# Altium footprint library LimeNet-Micro_2v1.PcbLib: 86 footprints (part 1 of 6)
Each footprint in its own frame and in the unit in brackets; x right, y up, seen from the top. Pads: shape width x height; smd on the part's side, far side on the other; paste and mask are expansions set on the pad; w line width, h text height; cw(c..) or ccw(c..) is an arc to the next point about the centre after c.
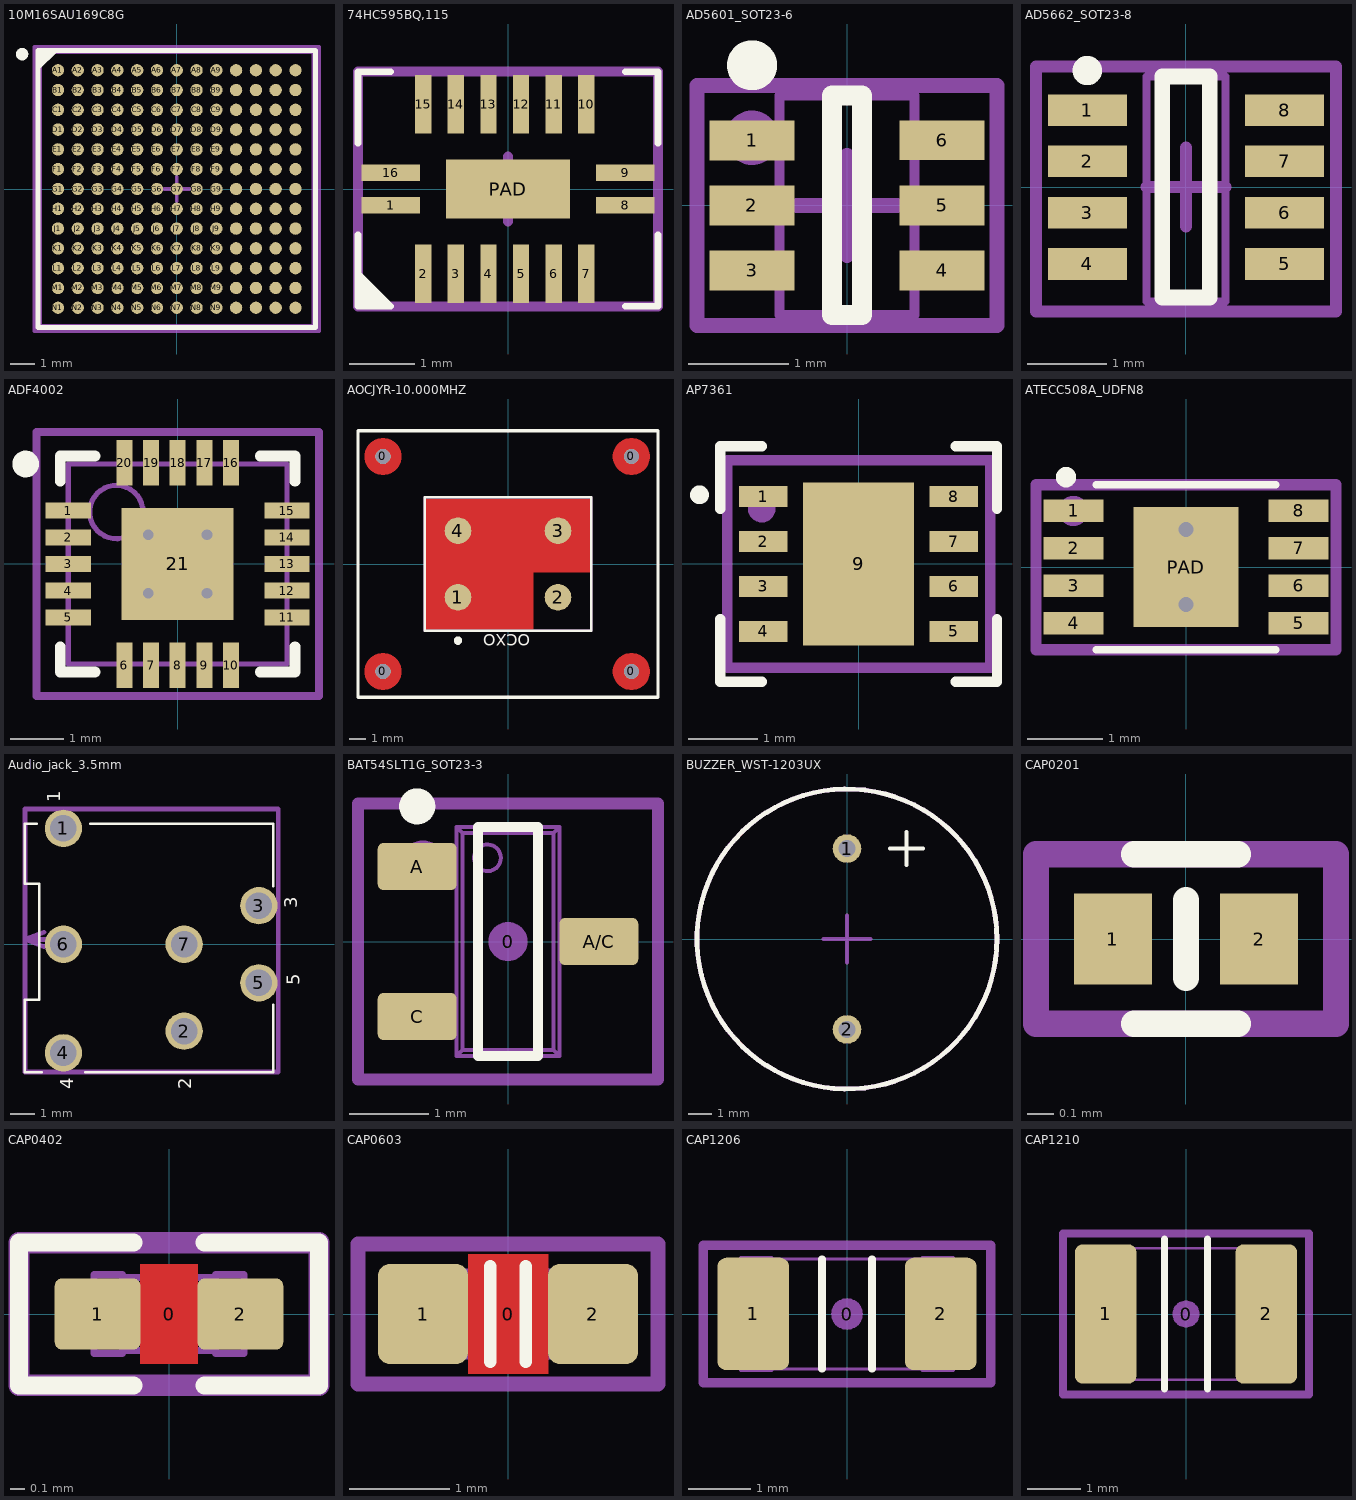
[diagram p0: the footprints below, top view; thin cyan lines are the x and y axes]

## 10M16SAU169C8G [mm]
pads (169):
  round 0.5 smd mask+0.05: A1(-4.8,4.8) A2(-4,4.8) A3(-3.2,4.8) A4(-2.4,4.8) A5(-1.6,4.8) A6(-0.8,4.8) A7(0,4.8) A8(0.8,4.8) A9(1.6,4.8) A10(2.4,4.8) A11(3.2,4.8) A12(4,4.8) A13(4.8,4.8) B1(-4.8,4) B2(-4,4) B3(-3.2,4) B4(-2.4,4) B5(-1.6,4) B6(-0.8,4) B7(0,4) B8(0.8,4) B9(1.6,4) B10(2.4,4) B11(3.2,4) B12(4,4) B13(4.8,4) C1(-4.8,3.2) C2(-4,3.2) C3(-3.2,3.2) C4(-2.4,3.2) C5(-1.6,3.2) C6(-0.8,3.2) C7(0,3.2) C8(0.8,3.2) C9(1.6,3.2) C10(2.4,3.2) C11(3.2,3.2) C12(4,3.2) C13(4.8,3.2) D1(-4.8,2.4) D2(-4,2.4) D3(-3.2,2.4) D4(-2.4,2.4) D5(-1.6,2.4) D6(-0.8,2.4) D7(0,2.4) D8(0.8,2.4) D9(1.6,2.4) D10(2.4,2.4) D11(3.2,2.4) D12(4,2.4) D13(4.8,2.4) E1(-4.8,1.6) E2(-4,1.6) E3(-3.2,1.6) E4(-2.4,1.6) E5(-1.6,1.6) E6(-0.8,1.6) E7(0,1.6) E8(0.8,1.6) E9(1.6,1.6) E10(2.4,1.6) E11(3.2,1.6) E12(4,1.6) E13(4.8,1.6) F1(-4.8,0.8) F2(-4,0.8) F3(-3.2,0.8) F4(-2.4,0.8) F5(-1.6,0.8) F6(-0.8,0.8) F7(0,0.8) F8(0.8,0.8) F9(1.6,0.8) F10(2.4,0.8) F11(3.2,0.8) F12(4,0.8) F13(4.8,0.8) G1(-4.8,0) G2(-4,0) G3(-3.2,0) G4(-2.4,0) G5(-1.6,0) G6(-0.8,0) G7(0,0) G8(0.8,0) G9(1.6,0) G10(2.4,0) G11(3.2,0) G12(4,0) G13(4.8,0) H1(-4.8,-0.8) H2(-4,-0.8) H3(-3.2,-0.8) H4(-2.4,-0.8) H5(-1.6,-0.8) H6(-0.8,-0.8) H7(0,-0.8) H8(0.8,-0.8) H9(1.6,-0.8) H10(2.4,-0.8) H11(3.2,-0.8) H12(4,-0.8) H13(4.8,-0.8) J1(-4.8,-1.6) J2(-4,-1.6) J3(-3.2,-1.6) J4(-2.4,-1.6) J5(-1.6,-1.6) J6(-0.8,-1.6) J7(0,-1.6) J8(0.8,-1.6) J9(1.6,-1.6) J10(2.4,-1.6) J11(3.2,-1.6) J12(4,-1.6) J13(4.8,-1.6) K1(-4.8,-2.4) K2(-4,-2.4) K3(-3.2,-2.4) K4(-2.4,-2.4) K5(-1.6,-2.4) K6(-0.8,-2.4) K7(0,-2.4) K8(0.8,-2.4) K9(1.6,-2.4) K10(2.4,-2.4) K11(3.2,-2.4) K12(4,-2.4) K13(4.8,-2.4) L1(-4.8,-3.2) L2(-4,-3.2) L3(-3.2,-3.2) L4(-2.4,-3.2) L5(-1.6,-3.2) L6(-0.8,-3.2) L7(0,-3.2) L8(0.8,-3.2) L9(1.6,-3.2) L10(2.4,-3.2) L11(3.2,-3.2) L12(4,-3.2) L13(4.8,-3.2) M1(-4.8,-4) M2(-4,-4) M3(-3.2,-4) M4(-2.4,-4) M5(-1.6,-4) M6(-0.8,-4) M7(0,-4) M8(0.8,-4) M9(1.6,-4) M10(2.4,-4) M11(3.2,-4) M12(4,-4) M13(4.8,-4) N1(-4.8,-4.8) N2(-4,-4.8) N3(-3.2,-4.8) N4(-2.4,-4.8) N5(-1.6,-4.8) N6(-0.8,-4.8) N7(0,-4.8) N8(0.8,-4.8) N9(1.6,-4.8) N10(2.4,-4.8) N11(3.2,-4.8) N12(4,-4.8) N13(4.8,-4.8)
Top Overlay:
  circle w0.25: c-6.25,5.45 r0.125
  region: -4.919,5.6 -5.6,4.919 -5.6,5.6
  lines w0.2: -5.6,4.919 -4.919,5.6 ; -5.6,-5.6 -5.6,5.6 5.6,5.6 5.6,-5.6 -5.6,-5.6
Mechanical 13:
  lines w0.1: -5.5,-5.5 -5.5,5.5 5.5,5.5 5.5,-5.5 -5.5,-5.5
Mechanical 15:
  circle w0.2: c-4.8,4.8 r0.1
  lines w0.15: -0.5,0 0.5,0 ; 0,-0.5 0,0.5 ; -5.75,-5.75 -5.75,5.75 5.75,5.75 5.75,-5.75 -5.75,-5.75
  text ".Designator" at 0.856,0.722 h0.55
3D body: height 1.55, standoff 0, extent -5.5,-5.5 5.5,5.5
3D body: height 1.65, standoff 1.55, extent -5.2,4.4 -4.4,5.2

## 74HC595BQ,115 [mm]
pads (17):
  rect 0.9x0.25 smd mask+0.05: 1(-1.8,-0.25) 8(1.8,-0.25) 9(1.8,0.25) 16(-1.8,0.25)
  rect 0.25x0.9 smd mask+0.05: 2(-1.3,-1.3) 3(-0.8,-1.3) 4(-0.3,-1.3) 5(0.2,-1.3) 6(0.7,-1.3) 7(1.2,-1.3) 10(1.2,1.3) 11(0.7,1.3) 12(0.2,1.3) 13(-0.3,1.3) 14(-0.8,1.3) 15(-1.3,1.3)
  rect 1.9x0.9 smd paste-2 mask+0.05: PAD(0,0)
Top Overlay:
  region: -1.8,-1.8 -2.3,-1.3 -2.3,-1.8
  lines w0.1: -2.3,-1 -2.3,-1.3 -1.8,-1.8 -2.3,-1.8 -2.3,-0.7 ; -2.3,0.7 -2.3,1.8 -1.8,1.8 ; 1.8,-1.8 2.3,-1.8 2.3,-0.7 ; 1.8,1.8 2.3,1.8 2.3,0.7
Top Paste:
  region: 0.55,0.2 0.55,-0.2 0.15,-0.2 0.15,0.2
  region: -0.55,0.2 -0.55,-0.2 -0.15,-0.2 -0.15,0.2
Mechanical 15:
  circle w0.1: c-1.825,-0.25 r0.05
  lines w0.15: -0.5,0 0,0 ; 0,-0.5 0,0 ; 0,0.5 0,0 ; 0.5,0 0,0 ; -2.3,-1.8 2.3,-1.8 2.3,1.8 -2.3,1.8 -2.3,-1.8
  text ".Designator" at 1.5,-1.05 h0.55
3D body: height 1, standoff 0, extent -1.8,-1.075 1.8,1.075

## AD5601_SOT23-6 [mm]
pads (6):
  rect 0.85x0.4 smd mask+0.05: 1(-0.95,0.65) 2(-0.95,0) 3(-0.95,-0.65) 4(0.95,-0.65) 5(0.95,0) 6(0.95,0.65)
Top Overlay:
  circle w0.25: c-0.95,1.4 r0.125
  lines w0.2: -0.15,-1.1 -0.15,1.1 0.15,1.1 0.15,-1.1 -0.15,-1.1
Mechanical 13:
  lines w0.1: -0.675,-1.1 0.675,-1.1 0.675,1.1 -0.675,1.1 -0.675,-1.1
Mechanical 15:
  circle w0.4: c-0.95,0.675 r0.071
  lines w0.15: -0.5,0 0.5,0 ; 0,-0.5 0,0.5 ; -1.5,-1.2 1.5,-1.2 1.5,1.2 -1.5,1.2 -1.5,-1.2
3D body "User Library-SC70-6.step": height 0.43, standoff -0.53, extent -1.05,-1 1.05,1

## AD5662_SOT23-8 [mm]
pads (8):
  rect 1x0.4 smd mask+0.05: 1(-1.25,0.975) 2(-1.25,0.325) 3(-1.25,-0.325) 4(-1.25,-0.975) 5(1.25,-0.975) 6(1.25,-0.325) 7(1.25,0.325) 8(1.25,0.975)
Top Overlay:
  circle w0.3: c-1.25,1.475 r0.035
  lines w0.2: -0.3,-1.4 0.3,-1.4 0.3,1.4 -0.3,1.4 -0.3,-1.4
Mechanical 13:
  lines w0.1: -0.5,-1.45 -0.5,1.4 0.5,1.4 0.5,-1.45 -0.5,-1.45
Mechanical 15:
  circle w0.2: c-1.275,0.975 r0.056
  lines w0.15: -0.5,0 0.5,0 ; 0,-0.5 0,0.5 ; -1.9,-1.575 -1.9,1.525 1.9,1.525 1.9,-1.575 -1.9,-1.575
  text ".Designator" at -0.875,-1.3 h0.55
3D body "User Library-sot238.step": height 1.2, standoff 0, extent -1.4,-1.49 1.4,1.45

## ADF4002 [mm]
pads (21):
  rect 0.85x0.3 smd mask+0.05: 1(-2.05,1) 2(-2.05,0.5) 3(-2.05,0) 4(-2.05,-0.5) 5(-2.05,-1) 11(2.05,-1) 12(2.05,-0.5) 13(2.05,0) 14(2.05,0.5) 15(2.05,1)
  rect 0.3x0.85 smd mask+0.05: 6(-1,-1.9) 7(-0.5,-1.9) 8(0,-1.9) 9(0.5,-1.9) 10(1,-1.9) 16(1,1.9) 17(0.5,1.9) 18(0,1.9) 19(-0.5,1.9) 20(-1,1.9)
  rect 2.1x2.1 smd: 21(0,0)
via 0.55,-0.55 diameter 0.5 hole 0.2
via -0.55,-0.55 diameter 0.5 hole 0.2
via 0.55,0.55 diameter 0.5 hole 0.2
via -0.55,0.55 diameter 0.5 hole 0.2
Top Overlay:
  circle w0.25: c-2.85,1.875 r0.125
  lines w0.2: -2.2,-1.55 -2.2,-2.025 -1.55,-2.025 ; -2.2,1.55 -2.2,2.025 -1.55,2.025 ; 1.55,-2.025 2.2,-2.025 2.2,-1.55 ; 1.55,2.025 2.2,2.025 2.2,1.55
Mechanical 13:
  circle w0.1: c-1.15,0.975 r0.5
  lines w0.1: -2.05,-1.875 2.05,-1.875 2.05,1.875 -2.05,1.875 -2.05,-1.875
Mechanical 15:
  lines w0.15: -0.5,0 0.5,0 ; 0,-0.5 0,0.5 ; -2.65,-2.475 2.65,-2.475 2.65,2.475 -2.65,2.475 -2.65,-2.475
  text ".Designator" at 0.925,0.913 h0.55
3D body "User Library-QFN4x4_20pins.step": height 0.8, standoff 0, extent -2.025,-2.02 2.015,2.02

## AOCJYR-10.000MHZ [mm]
pads (8):
  round 0.9 hole 0.9 unplated: 0(-7.5,6.45) 0(-7.5,-6.45) 0(7.4,-6.45) 0(7.4,6.45)
  round 1.6 smd mask+0.05: 1(-3,-2) 2(3,-2) 3(3,2) 4(-3,2)
Top Layer:
  pour cut-out: 4.9,-0.5 4.9,3.9 -4.9,3.9 -4.9,-3.9 1.525,-3.9 1.525,-0.5
  pour cut-out: 7.4,6.45 7.4,7.55 7.508,7.55 7.721,7.508 7.921,7.425 8.101,7.304 8.254,7.151 8.375,6.971 8.458,6.771 8.5,6.558 8.5,6.45
  pour cut-out: 7.4,6.45 7.4,5.35 7.292,5.35 7.079,5.392 6.879,5.475 6.699,5.596 6.546,5.749 6.425,5.929 6.342,6.129 6.3,6.342 6.3,6.45
  pour cut-out: 7.4,6.45 6.3,6.45 6.3,6.558 6.342,6.771 6.425,6.971 6.546,7.151 6.699,7.304 6.879,7.425 7.079,7.508 7.292,7.55 7.4,7.55
  pour cut-out: 7.4,6.45 8.5,6.45 8.5,6.342 8.458,6.129 8.375,5.929 8.254,5.749 8.101,5.596 7.921,5.475 7.721,5.392 7.508,5.35 7.4,5.35
  pour cut-out: -7.5,6.45 -7.5,7.55 -7.392,7.55 -7.179,7.508 -6.979,7.425 -6.799,7.304 -6.646,7.151 -6.525,6.971 -6.442,6.771 -6.4,6.558 -6.4,6.45
  pour cut-out: -7.5,6.45 -7.5,5.35 -7.608,5.35 -7.821,5.392 -8.021,5.475 -8.201,5.596 -8.354,5.749 -8.475,5.929 -8.558,6.129 -8.6,6.342 -8.6,6.45
  pour cut-out: -7.5,6.45 -8.6,6.45 -8.6,6.558 -8.558,6.771 -8.475,6.971 -8.354,7.151 -8.201,7.304 -8.021,7.425 -7.821,7.508 -7.608,7.55 -7.5,7.55
  pour cut-out: -7.5,6.45 -6.4,6.45 -6.4,6.342 -6.442,6.129 -6.525,5.929 -6.646,5.749 -6.799,5.596 -6.979,5.475 -7.179,5.392 -7.392,5.35 -7.5,5.35
  pour cut-out: -7.5,-6.45 -7.5,-5.35 -7.392,-5.35 -7.179,-5.392 -6.979,-5.475 -6.799,-5.596 -6.646,-5.749 -6.525,-5.929 -6.442,-6.129 -6.4,-6.342 -6.4,-6.45
  pour cut-out: -7.5,-6.45 -7.5,-7.55 -7.608,-7.55 -7.821,-7.508 -8.021,-7.425 -8.201,-7.304 -8.354,-7.151 -8.475,-6.971 -8.558,-6.771 -8.6,-6.558 -8.6,-6.45
  pour cut-out: -7.5,-6.45 -8.6,-6.45 -8.6,-6.342 -8.558,-6.129 -8.475,-5.929 -8.354,-5.749 -8.201,-5.596 -8.021,-5.475 -7.821,-5.392 -7.608,-5.35 -7.5,-5.35
  pour cut-out: -7.5,-6.45 -6.4,-6.45 -6.4,-6.558 -6.442,-6.771 -6.525,-6.971 -6.646,-7.151 -6.799,-7.304 -6.979,-7.425 -7.179,-7.508 -7.392,-7.55 -7.5,-7.55
  pour cut-out: 7.4,-6.45 8.5,-6.45 8.5,-6.558 8.458,-6.771 8.375,-6.971 8.254,-7.151 8.101,-7.304 7.921,-7.425 7.721,-7.508 7.508,-7.55 7.4,-7.55
  pour cut-out: 7.4,-6.45 6.3,-6.45 6.3,-6.342 6.342,-6.129 6.425,-5.929 6.546,-5.749 6.699,-5.596 6.879,-5.475 7.079,-5.392 7.292,-5.35 7.4,-5.35
  pour cut-out: 7.4,-6.45 7.4,-7.55 7.292,-7.55 7.079,-7.508 6.879,-7.425 6.699,-7.304 6.546,-7.151 6.425,-6.971 6.342,-6.771 6.3,-6.558 6.3,-6.45
  pour cut-out: 7.4,-6.45 7.4,-5.35 7.508,-5.35 7.721,-5.392 7.921,-5.475 8.101,-5.596 8.254,-5.749 8.375,-5.929 8.458,-6.129 8.5,-6.342 8.5,-6.45
Top Overlay:
  circle w0.3: c-3,-4.6 r0.1
  lines w0.15: -5,-4 5,-4 5,4 -5,4 -5,-4
  lines w0.2: -9,-8 -9,8 9,8 9,-8 -9,-8
  text "OCXO" at 1.325,-4.225 h0.7
Top Solder:
  drawing of 16 lines, arcs and shapes, not listed
Mechanical 15:
  circle w0.3: c-3,-2 r0.141
  lines w0.15: -1.25,0 1.25,0 ; 0,-1.25 0,1.25 ; -5,-4 -5,4 5,4 5,-4 -5,-4
  text ".Designator" at 2.225,-0.575 h0.55
3D body: height 4.1, standoff 0, extent -4.85,-3.75 4.85,3.75
3D body: height 4.2, standoff 4.1, extent -3.492,-2.498 -2.496,-1.5
3D body: height 0.4, standoff 0, extent -4.9,-3 -4.75,3
3D body: height 0.4, standoff 0, extent 4.75,-3 4.9,3

## AP7361 [mm]
pads (9):
  rect 0.7x0.3 smd mask+0.05: 1(-1.375,0.975) 2(-1.375,0.325) 3(-1.375,-0.325) 4(-1.375,-0.975) 5(1.375,-0.975) 6(1.375,-0.325) 7(1.375,0.325) 8(1.375,0.975)
  rect 1.6x2.35 smd mask+0.05: 9(0,0)
Top Overlay:
  circle w0.2: c-2.3,1 r0.035
  lines w0.15: -2,-0.8 -2,-1.7 -1.4,-1.7 ; -2,0.8 -2,1.7 -1.4,1.7 ; 1.4,-1.7 2,-1.7 2,-0.8 ; 1.4,1.7 2,1.7 2,0.8
Mechanical 15:
  circle w0.2: c-1.4,0.8 r0.1
  lines w0.15: -0.4,0 0,0 ; 0,-0.4 0,0 ; 0,0.4 0,0 ; 0.4,0 0,0 ; -1.9,-1.5 1.9,-1.5 1.9,1.5 -1.9,1.5 -1.9,-1.5
  text ".Designator" at 0.93,1.214 h0.55
3D body "User Library-DFN8_3x3mm__65mm.step": height 0.8, standoff 0, extent -1.52,-1.5 1.5,1.5

## ATECC508A_UDFN8 [mm]
pads (9):
  rect 0.8x0.3 smd mask+0.05: 1(-1.5,0.75) 2(-1.5,0.25) 3(-1.5,-0.25) 4(-1.5,-0.75) 5(1.5,-0.75) 6(1.5,-0.25) 7(1.5,0.25) 8(1.5,0.75)
  rect 1.4x1.6 smd mask+0.05: PAD(0,0)
via 0,-0.5 diameter 0.4 hole 0.2
via 0,0.5 diameter 0.4 hole 0.2
Top Overlay:
  circle w0.2: c-1.6,1.2 r0.035
  lines w0.1: -1.2,-1.1 1.2,-1.1 ; -1.2,1.1 1.2,1.1
Mechanical 15:
  circle w0.3: c-1.5,0.75 r0.05
  lines w0.15: -0.3,0 0.3,0 ; 0,-0.3 0,0.3 ; -2,-1.1 -2,1.1 2,1.1 2,-1.1 -2,-1.1
  text ".Designator" at -1.3,-0.9 h0.55
3D body "User Library-UDFN-8_2X3_0,5.step": height 0.53, standoff 0, extent -1.5,-1 1.5,1

## Audio_jack_3.5mm [mm]
pads (7):
  round 1.55 hole 1.1 mask+0.05: 1(2.9,4.8) 2(7.9,-3.6) 3(11,1.6) 4(2.9,-4.5) 5(11,-1.6) 6(2.9,0) 7(7.9,0)
Top Overlay:
  lines w0.1: 1.8,5 1.3,5 1.3,2.5 1.9,2.5 1.9,-2.3 1.3,-2.3 1.3,-5.3 2,-5.3 ; 3.8,-5.3 11.6,-5.3 11.6,-2.5 ; 4,5 11.6,5 11.6,2.4
  text "5" at 12.7,-1.7 h0.55
  text "4" at 3.3,-6 h0.55
  text "3" at 12.6,1.5 h0.55
  text "2" at 8.2,-6 h0.55
  text "1" at 2.775,5.885 h0.55
Mechanical 15:
  lines w0.2: 2.1,-0.1 1.3,0.2 ; 2.1,0.5 1.3,0.2 ; 2.8,0.2 1.3,0.2 ; 1.3,-5.3 1.3,5.6 11.8,5.6 11.8,-5.3 1.3,-5.3
  text "1" at 3.2,3.5 h0.55
  text "2" at 6.8,-3.8 h0.55
  text "3" at 9.9,1.5 h0.55
  text "4" at 3.2,-3.4 h0.55
  text "5" at 9.9,-1.7 h0.55
  text ".Designator" at 6.925,-0.615 h0.55
  text "Board edge" at 3.6,-2.7 h0.55
3D body "SJ-43514.stp": height 5.2, standoff -2.05, extent -2.5,-5.3 11.5,4.9

## BAT54SLT1G_SOT23-3 [mm]
pads (4):
  round 0.5 on Mech15: 0(0,0)
  rrect25% 1x0.6 smd: A(-1.15,0.95) A/C(1.15,0) C(-1.15,-0.95)
Top Overlay:
  circle w0.254: c-1.15,1.712 r0.102
  lines w0.127: -0.381,-1.45 -0.381,1.45 0.381,1.45 0.381,-1.45 -0.381,-1.45
Mechanical 13:
  circle w0.05: c-0.26,1.06 r0.169
  lines w0.05: -1.19,-1.19 -1.19,-0.71 ; -1.19,0.71 -1.19,1.19 ; -1.099,-1.19 -1.099,-0.71 ; -1.099,0.71 -1.099,1.19 ; -1.074,-1.19 -1.074,-0.71 ; -1.074,0.71 -1.074,1.19 ; -0.825,-1.19 -0.825,-0.71 ; -0.825,0.71 -0.825,1.19 ; -0.65,-1.19 -1.4,-1.19 -1.4,-0.71 -0.65,-0.71 ; -0.65,0.71 -1.4,0.71 -1.4,1.19 -0.65,1.19 ; 0.65,-0.24 1.4,-0.24 1.4,0.24 0.65,0.24 ; 0.825,-0.24 0.825,0.24 ; 1.074,-0.24 1.074,0.24 ; 1.099,-0.24 1.099,0.24 ; 1.19,-0.24 1.19,0.24 ; -0.65,-1.45 0.65,-1.45 ; -0.65,-1.45 -0.65,1.45 ; -0.65,-1.45 -0.576,-1.376 ; -0.65,1.45 -0.576,1.376 ; -0.65,1.45 0.65,1.45 ; -0.576,-1.376 0.576,-1.376 ; -0.576,-1.376 -0.576,1.376 ; -0.576,1.376 0.576,1.376 ; 0.576,-1.376 0.65,-1.45 ; 0.576,-1.376 0.576,1.376 ; 0.576,1.376 0.65,1.45 ; 0.65,-1.45 0.65,1.45
Mechanical 15:
  circle w0.35: c-1.073,0.975 r0.127
  lines w0.15: -1.9,-1.75 -1.9,1.75 1.9,1.75 1.9,-1.75 -1.9,-1.75
  text ".Designator" at -1.125,0.45 h0.55
3D body "SOT23-3.STEP": height 1.29, standoff -0.01, extent -1.4,-1.45 1.4,1.45

## BUZZER_WST-1203UX [mm]
pads (2):
  round 1.2 hole 0.7 mask+0.05: 1(0,3.8) 2(0,-3.8)
Top Overlay:
  circle w0.2: c0,0 r6.3
  lines w0.15: 1.8,3.8 3.2,3.8 ; 2.5,3.1 2.5,4.5
Mechanical 15:
  circle w0.2: c0,0 r6.301
  lines w0.15: -1,0 0,0 ; 0,-1 0,0 ; 0,1 0,0 ; 1,0 0,0
  text "positive (longer pin)" at -1.5,-5.175 h0.55
  text ".Designator" at 2.1,-0.45 h0.55
3D body "User Library-WST-1203UX.step": height 9.65, standoff -4.5, extent -6,-6.027 6,9.427

## CAP0201 [mm]
pads (2):
  rect 0.3x0.35 smd mask+0.05: 1(-0.28,0) 2(0.28,0)
Top Overlay:
  lines w0.1: -0.2,-0.325 0.2,-0.325 ; -0.2,0.325 0.2,0.325 ; 0,-0.15 0,0.15
Mechanical 15:
  circle w0.05: c0,0 r0.025
  lines w0.1: -0.575,-0.325 -0.575,0.325 0.575,0.325 0.575,-0.325 -0.575,-0.325
  text ".Designator" at 0.255,-8 h0.55
3D body: height 0.25, standoff 0, extent 0.17,-0.15 0.3,0.15
3D body: height 0.25, standoff 0, extent -0.3,-0.15 -0.17,0.15
3D body: height 0.25, standoff 0, extent -0.17,-0.15 0.17,0.15

## CAP0402 [mm]
pads (3):
  round 0.2 on Mech15: 0(0,0)
  rrect20% 0.6x0.5 smd: 1(-0.5,0) 2(0.5,0)
Top Layer:
  pour cut-out: -0.2,0.35 0.2,0.35 0.2,-0.35 -0.2,-0.35
Top Overlay:
  lines w0.127: -0.25,-0.5 -1.05,-0.5 -1.05,0.5 -0.25,0.5 ; 0.25,-0.5 1.05,-0.5 1.05,0.5 0.25,0.5
Mechanical 13:
  lines w0.05: -0.325,-0.255 0.325,-0.255 ; -0.325,0.255 0.325,0.255 ; -0.525,-0.275 -0.325,-0.275 -0.325,0.275 -0.525,0.275 -0.525,-0.275 ; 0.325,-0.275 0.325,0.275 0.525,0.275 0.525,-0.275 0.325,-0.275
Mechanical 15:
  lines w0.15: -1.05,-0.5 1.05,-0.5 1.05,0.5 -1.05,0.5 -1.05,-0.5
  text ".Designator" at -0.972,-1.375 h0.55
3D body "CAP 0402 (1005 metric).STEP": height 0.55, standoff 0, extent -0.525,-0.275 0.525,0.275

## CAP0603 [mm]
pads (3):
  round 0.254 on Mech15: 0(0,0)
  rrect25% 0.9x1 smd: 1(-0.85,0) 2(0.85,0)
Top Layer:
  pour cut-out: -0.4,0.6 0.4,0.6 0.4,-0.6 -0.4,-0.6
Top Overlay:
  lines w0.127: -0.178,-0.476 -0.178,0.476 ; 0.178,-0.476 0.178,0.476
Mechanical 13:
  lines w0.05: -0.55,-0.43 0.55,-0.43 ; -0.55,0.43 0.55,0.43 ; -0.85,-0.45 -0.55,-0.45 -0.55,0.45 -0.85,0.45 -0.85,-0.45 ; 0.55,-0.45 0.85,-0.45 0.85,0.45 0.55,0.45 0.55,-0.45
Mechanical 15:
  lines w0.15: -1.5,-0.7 1.5,-0.7 1.5,0.7 -1.5,0.7 -1.5,-0.7
  text ".Designator" at -1.1,-1.43 h0.55
3D body "CAP_0603.STEP": height 0.89, standoff -0.01, extent -0.85,-0.45 0.85,0.45

## CAP1206 [mm]
pads (3):
  round 0.508 on Mech15: 0(0,0)
  rrect25% 1.15x1.8 smd: 1(-1.5,0) 2(1.5,0)
Top Overlay:
  lines w0.127: -0.4,-0.876 -0.4,0.876 ; 0.4,-0.876 0.4,0.876
Mechanical 13:
  lines w0.05: -1.2,-0.88 1.2,-0.88 ; -1.2,0.88 1.2,0.88 ; -1.7,-0.9 -1.7,0.9 -1.2,0.9 -1.2,-0.9 -1.7,-0.9 ; 1.2,-0.9 1.2,0.9 1.7,0.9 1.7,-0.9 1.2,-0.9
Mechanical 15:
  lines w0.15: -2.3,-1.1 2.3,-1.1 2.3,1.1 -2.3,1.1 -2.3,-1.1
  text ".Designator" at 1.05,0.9 h0.55
3D body "CAP_1206.STEP": height 1.74, standoff -0.01, extent -1.7,-0.9 1.7,0.9

## CAP1210 [mm]
pads (3):
  round 0.508 on Mech15: 0(0,0)
  rrect25% 1.15x2.6 smd: 1(-1.5,0) 2(1.5,0)
Top Overlay:
  lines w0.127: -0.4,-1.4 -0.4,1.4 ; 0.4,-1.4 0.4,1.4
Mechanical 13:
  lines w0.05: -1.2,-1.25 -1.6,-1.25 -1.6,1.25 -1.2,1.25 ; 1.2,-1.25 1.6,-1.25 1.6,1.25 1.2,1.25 ; -1.2,-1.23 -1.2,1.23 1.2,1.23 1.2,-1.23 -1.2,-1.23
Mechanical 15:
  lines w0.15: -2.3,-1.5 2.3,-1.5 2.3,1.5 -2.3,1.5 -2.3,-1.5
  text ".Designator" at -1.145,0.45 h0.55
3D body "User Library-CAPC3225X13.step": height 1.29, standoff -0.01, extent -1.6,-1.25 1.6,1.25